# Altium footprint library ICs And Semiconductors THD.PcbLib: 350 footprints (part 1 of 22) (continued)
## APEX_PA93_h [mm] "Power SIP, EC Package Style, Pitch 2.54mm, Right Angle Formed Leads For Horizontal Mount" (continued)
Notvisible:
  circle w0.1: c11.43,0.003 r1
  circle w0.1: c6.35,0.003 r1
  circle w0.1: c-3.81,0.003 r1
  circle w0.1: c-8.89,0.003 r1
  circle w0.1: c0,21.003 r2.75
  circle w0.1: c-13.97,0.003 r1
  circle w0.1: c-11.43,0.003 r1
  circle w0.1: c-6.35,0.003 r1
  circle w0.1: c-1.27,0.003 r1
  circle w0.1: c1.27,0.003 r1
  circle w0.1: c3.81,0.003 r1
  circle w0.1: c8.89,0.003 r1
  circle w0.1: c13.97,0.003 r1
  lines w0.1: -14.97,0.003 -13.97,0.003 -13.97,-0.997 ; -14.36,0.984 cw(c-14.719,0.625) -14.32,0.94 ; -13.62,0.94 cw(c-13.221,0.625) -13.58,0.984 ; -12.43,0.003 -11.43,0.003 -11.43,-0.997 ; -11.82,0.984 cw(c-12.179,0.625) -11.78,0.94 ; -11.08,0.94 cw(c-10.681,0.625) -11.04,0.984 ; -9.89,0.003 -8.89,0.003 -8.89,-0.997 ; -9.28,0.984 cw(c-9.639,0.625) -9.24,0.94 ; -8.54,0.94 cw(c-8.141,0.625) -8.5,0.984 ; -7.35,0.003 -6.35,0.003 -6.35,-0.997 ; -6.74,0.984 cw(c-7.099,0.625) -6.7,0.94 ; -6,0.94 cw(c-5.601,0.625) -5.96,0.984 ; -4.81,0.003 -3.81,0.003 -3.81,-0.997 ; -4.2,0.984 cw(c-4.559,0.625) -4.16,0.94 ; -3.46,0.94 cw(c-3.061,0.625) -3.42,0.984 ; -2.27,0.003 -1.27,0.003 -1.27,-0.997 ; -1.66,0.984 cw(c-2.019,0.625) -1.62,0.94 ; -0.92,0.94 cw(c-0.521,0.625) -0.88,0.984 ; -0.508,21.003 0,21.003 0,20.495 ; 0.27,0.003 1.27,0.003 1.27,-0.997 ; 0.88,0.984 cw(c0.521,0.625) 0.92,0.94 ; 1.62,0.94 cw(c2.019,0.625) 1.66,0.984 ; 2.81,0.003 3.81,0.003 3.81,-0.997 ; 3.42,0.984 cw(c3.061,0.625) 3.46,0.94 ; 4.16,0.94 cw(c4.559,0.625) 4.2,0.984 ; 5.35,0.003 6.35,0.003 6.35,-0.997 ; 5.96,0.984 cw(c5.601,0.625) 6,0.94 ; 6.7,0.94 cw(c7.099,0.625) 6.74,0.984 ; 7.89,0.003 8.89,0.003 8.89,-0.997 ; 8.5,0.984 cw(c8.141,0.625) 8.54,0.94 ; 9.24,0.94 cw(c9.639,0.625) 9.28,0.984 ; 10.43,0.003 11.43,0.003 11.43,-0.997 ; 11.04,0.984 cw(c10.681,0.625) 11.08,0.94 ; 11.78,0.94 cw(c12.179,0.625) 11.82,0.984 ; 12.97,0.003 13.97,0.003 13.97,-0.997 ; 13.58,0.984 cw(c13.221,0.625) 13.62,0.94 ; 14.32,0.94 cw(c14.719,0.625) 14.36,0.984
  text "! ADD COPPER & TOP SOLDER FOR CASE !" at -15.24,10.795 h1
Mechanical 14:
  drawing of 190 lines, arcs and shapes, not listed
3D body "APEX_PA93_h.stp": height 6.86, standoff -1.86, extent -15.494,-0.213 15.494,23.645

## APEX_PA93_v [mm] "Power 12 Pin SIP, DP Package Style, Pitch 2.54mm, Straight Leads For Vertical Mount"
height 23.14
pads (12):
  round 1.6 hole 0.9: 1(-13.97,0) 2(-11.43,0) 3(-8.89,0) 4(-6.35,0) 5(-3.81,0) 6(-1.27,0) 7(1.27,0) 8(3.81,0) 9(6.35,0) 10(8.89,0) 11(11.43,0) 12(13.97,0)
Top Overlay:
  circle w0.3: c-13.97,-1.905 r0.15
  lines w0.2: -15.494,1.118 15.494,1.118 ; -15.494,2.134 15.494,2.134 ; -15.24,-2.616 -15.24,-2.87 15.24,-2.87 15.24,-2.616 ; -1.981,2.134 -1.981,3.988 ; 1.981,2.134 1.981,3.988 ; -15.494,-2.616 -15.494,3.988 15.494,3.988 15.494,-2.616 -15.494,-2.616
Notvisible:
  lines w0.1: -14.97,0 -13.97,0 -13.97,-1 ; -14.211,-0.216 -14.211,0.216 ; -13.729,-0.216 -13.729,0.216 ; -12.43,0 -11.43,0 -11.43,-1 ; -11.671,-0.216 -11.671,0.216 ; -11.189,-0.216 -11.189,0.216 ; -7.35,0 -6.35,0 -6.35,-1 ; -6.591,-0.216 -6.591,0.216 ; -6.109,-0.216 -6.109,0.216 ; -2.27,0 -1.27,0 -1.27,-1 ; -1.511,-0.216 -1.511,0.216 ; -1.029,-0.216 -1.029,0.216 ; 0.27,0 1.27,0 1.27,-1 ; 1.029,-0.216 1.029,0.216 ; 1.511,-0.216 1.511,0.216 ; 2.81,0 3.81,0 3.81,-1 ; 3.569,-0.216 3.569,0.216 ; 4.051,-0.216 4.051,0.216 ; 7.89,0 8.89,0 8.89,-1 ; 8.649,-0.216 8.649,0.216 ; 9.131,-0.216 9.131,0.216 ; 12.97,0 13.97,0 13.97,-1 ; 13.729,-0.216 13.729,0.216 ; 14.211,-0.216 14.211,0.216 ; -14.605,-0.216 -14.605,0.216 -13.335,0.216 -13.335,-0.216 -14.605,-0.216 ; -12.065,-0.216 -12.065,0.216 -10.795,0.216 -10.795,-0.216 -12.065,-0.216 ; -6.985,-0.216 -6.985,0.216 -5.715,0.216 -5.715,-0.216 -6.985,-0.216 ; -1.905,-0.216 -1.905,0.216 -0.635,0.216 -0.635,-0.216 -1.905,-0.216 ; 0.635,-0.216 0.635,0.216 1.905,0.216 1.905,-0.216 0.635,-0.216 ; 3.175,-0.216 3.175,0.216 4.445,0.216 4.445,-0.216 3.175,-0.216 ; 8.255,-0.216 8.255,0.216 9.525,0.216 9.525,-0.216 8.255,-0.216 ; 13.335,-0.216 13.335,0.216 14.605,0.216 14.605,-0.216 13.335,-0.216
Mechanical 14:
  circle w0.3: c-13.97,-1.905 r0.15
  lines w0.1: -15.494,1.118 15.494,1.118 ; -15.494,2.134 15.494,2.134 ; -15.24,-2.616 -15.24,-2.87 15.24,-2.87 15.24,-2.616 ; -1.981,2.134 -1.981,3.988 ; 1.981,2.134 1.981,3.988 ; -15.494,-2.616 -15.494,3.988 15.494,3.988 15.494,-2.616 -15.494,-2.616
3D body "APEX_PA93_v.stp": height 23.14, standoff -3.1, extent -15.494,-2.87 15.494,3.988

## APEX_PA94_h [mm] "Power SIP, EC Package Style, Pitch 2.54mm, Right Angle Formed Leads For Horizontal Mount"
height 6.86
pads (8):
  round 1.6 hole 0.9: 1(-13.97,0) 2(-11.43,0) 4(-6.35,0) 6(-1.27,0) 7(1.27,0) 8(3.81,0) 10(8.89,0) 12(13.97,0)
Top Overlay:
  circle w0.3: c-13.97,1.905 r0.15
  lines w0.2: -15.24,4.595 -15.24,1.725 -14.605,1.725 ; -14.732,16.66 ccw(c-14.732,17.422) -13.97,17.422 -13.97,17.777 -2.535,23.603 cw(c-2.362,23.264) -1.981,23.264 -1.981,21.003 ccw(c0,21.003) 1.981,21.003 1.981,23.264 cw(c2.362,23.264) 2.535,23.603 13.97,17.777 13.97,17.422 ccw(c14.732,17.422) 14.732,16.66 ; -14.478,4.595 -14.478,3.426 -14.605,3.02 -14.605,1.229 -14.36,0.984 ; -13.58,0.984 -13.335,1.229 -13.335,3.02 -13.462,3.426 -13.462,4.595 ; -13.335,1.725 -12.065,1.725 ; -11.938,4.595 -11.938,3.426 -12.065,3.02 -12.065,1.229 -11.82,0.984 ; -11.04,0.984 -10.795,1.229 -10.795,3.02 -10.922,3.426 -10.922,4.595 ; -10.795,1.725 -6.985,1.725 ; -6.858,4.595 -6.858,3.426 -6.985,3.02 -6.985,1.229 -6.74,0.984 ; -5.96,0.984 -5.715,1.229 -5.715,3.02 -5.842,3.426 -5.842,4.595 ; -5.715,1.725 -1.905,1.725 ; -1.778,4.595 -1.778,3.426 -1.905,3.02 -1.905,1.229 -1.66,0.984 ; -0.88,0.984 -0.635,1.229 -0.635,3.02 -0.762,3.426 -0.762,4.595 ; -0.635,1.725 0.635,1.725 ; 0.762,4.595 0.762,3.426 0.635,3.02 0.635,1.229 0.88,0.984 ; 1.66,0.984 1.905,1.229 1.905,3.02 1.778,3.426 1.778,4.595 ; 1.905,1.725 3.175,1.725 ; 3.302,4.595 3.302,3.426 3.175,3.02 3.175,1.229 3.42,0.984 ; 4.2,0.984 4.445,1.229 4.445,3.02 4.318,3.426 4.318,4.595 ; 4.445,1.725 8.255,1.725 ; 8.382,4.595 8.382,3.426 8.255,3.02 8.255,1.229 8.5,0.984 ; 9.28,0.984 9.525,1.229 9.525,3.02 9.398,3.426 9.398,4.595 ; 9.525,1.725 13.335,1.725 ; 13.462,4.595 13.462,3.426 13.335,3.02 13.335,1.229 13.58,0.984 ; 14.36,0.984 14.605,1.229 14.605,3.02 14.478,3.426 14.478,4.595 ; 14.605,1.725 15.24,1.725 15.24,4.595 ; -15.494,4.595 15.494,4.595 15.494,16.66 -15.494,16.66 -15.494,4.595 ; -15.24,4.849 15.24,4.849 15.24,16.406 -15.24,16.406 -15.24,4.849 ; -14.478,5.611 -13.785,6.881 -13.093,5.611 -14.478,5.611
Notvisible:
  circle w0.1: c0,21.003 r2.75
  circle w0.1: c-13.97,0.003 r1
  circle w0.1: c-11.43,0.003 r1
  circle w0.1: c-6.35,0.003 r1
  circle w0.1: c-1.27,0.003 r1
  circle w0.1: c1.27,0.003 r1
  circle w0.1: c3.81,0.003 r1
  circle w0.1: c8.89,0.003 r1
  circle w0.1: c13.97,0.003 r1
  lines w0.1: -14.97,0.003 -13.97,0.003 -13.97,-0.997 ; -14.36,0.984 cw(c-14.719,0.625) -14.32,0.94 ; -13.62,0.94 cw(c-13.221,0.625) -13.58,0.984 ; -12.43,0.003 -11.43,0.003 -11.43,-0.997 ; -11.82,0.984 cw(c-12.179,0.625) -11.78,0.94 ; -11.08,0.94 cw(c-10.681,0.625) -11.04,0.984 ; -7.35,0.003 -6.35,0.003 -6.35,-0.997 ; -6.74,0.984 cw(c-7.099,0.625) -6.7,0.94 ; -6,0.94 cw(c-5.601,0.625) -5.96,0.984 ; -2.27,0.003 -1.27,0.003 -1.27,-0.997 ; -1.66,0.984 cw(c-2.019,0.625) -1.62,0.94 ; -0.92,0.94 cw(c-0.521,0.625) -0.88,0.984 ; -0.508,21.003 0,21.003 0,20.495 ; 0.27,0.003 1.27,0.003 1.27,-0.997 ; 0.88,0.984 cw(c0.521,0.625) 0.92,0.94 ; 1.62,0.94 cw(c2.019,0.625) 1.66,0.984 ; 2.81,0.003 3.81,0.003 3.81,-0.997 ; 3.42,0.984 cw(c3.061,0.625) 3.46,0.94 ; 4.16,0.94 cw(c4.559,0.625) 4.2,0.984 ; 7.89,0.003 8.89,0.003 8.89,-0.997 ; 8.5,0.984 cw(c8.141,0.625) 8.54,0.94 ; 9.24,0.94 cw(c9.639,0.625) 9.28,0.984 ; 12.97,0.003 13.97,0.003 13.97,-0.997 ; 13.58,0.984 cw(c13.221,0.625) 13.62,0.94 ; 14.32,0.94 cw(c14.719,0.625) 14.36,0.984
  text "! ADD COPPER & TOP SOLDER FOR CASE !" at -15.24,10.795 h1
Mechanical 14:
  circle w0.3: c-13.97,1.905 r0.15
  lines w0.1: -15.24,4.595 -15.24,1.725 -14.605,1.725 ; -14.732,16.66 ccw(c-14.732,17.422) -13.97,17.422 -13.97,17.777 -2.535,23.603 cw(c-2.362,23.264) -1.981,23.264 -1.981,21.003 ccw(c0,21.003) 1.981,21.003 1.981,23.264 cw(c2.362,23.264) 2.535,23.603 13.97,17.777 13.97,17.422 ccw(c14.732,17.422) 14.732,16.66 ; -14.478,4.595 -14.478,3.426 -14.605,3.02 -14.605,1.229 -14.36,0.984 cw(c-14.719,0.625) -14.211,0.625 -14.211,-0.213 -13.729,-0.213 -13.729,0.625 cw(c-13.221,0.625) -13.58,0.984 -13.335,1.229 -13.335,3.02 -13.462,3.426 -13.462,4.595 ; -13.335,1.725 -12.065,1.725 ; -11.938,4.595 -11.938,3.426 -12.065,3.02 -12.065,1.229 -11.82,0.984 cw(c-12.179,0.625) -11.671,0.625 -11.671,-0.213 -11.189,-0.213 -11.189,0.625 cw(c-10.681,0.625) -11.04,0.984 -10.795,1.229 -10.795,3.02 -10.922,3.426 -10.922,4.595 ; -10.795,1.725 -6.985,1.725 ; -6.858,4.595 -6.858,3.426 -6.985,3.02 -6.985,1.229 -6.74,0.984 cw(c-7.099,0.625) -6.591,0.625 -6.591,-0.213 -6.109,-0.213 -6.109,0.625 cw(c-5.601,0.625) -5.96,0.984 -5.715,1.229 -5.715,3.02 -5.842,3.426 -5.842,4.595 ; -5.715,1.725 -1.905,1.725 ; -1.778,4.595 -1.778,3.426 -1.905,3.02 -1.905,1.229 -1.66,0.984 cw(c-2.019,0.625) -1.511,0.625 -1.511,-0.213 -1.029,-0.213 -1.029,0.625 cw(c-0.521,0.625) -0.88,0.984 -0.635,1.229 -0.635,3.02 -0.762,3.426 -0.762,4.595 ; -0.635,1.725 0.635,1.725 ; 0.762,4.595 0.762,3.426 0.635,3.02 0.635,1.229 0.88,0.984 cw(c0.521,0.625) 1.029,0.625 1.029,-0.213 1.511,-0.213 1.511,0.625 cw(c2.019,0.625) 1.66,0.984 1.905,1.229 1.905,3.02 1.778,3.426 1.778,4.595 ; 1.905,1.725 3.175,1.725 ; 3.302,4.595 3.302,3.426 3.175,3.02 3.175,1.229 3.42,0.984 cw(c3.061,0.625) 3.569,0.625 3.569,-0.213 4.051,-0.213 4.051,0.625 cw(c4.559,0.625) 4.2,0.984 4.445,1.229 4.445,3.02 4.318,3.426 4.318,4.595 ; 4.445,1.725 8.255,1.725 ; 8.382,4.595 8.382,3.426 8.255,3.02 8.255,1.229 8.5,0.984 cw(c8.141,0.625) 8.649,0.625 8.649,-0.213 9.131,-0.213 9.131,0.625 cw(c9.639,0.625) 9.28,0.984 9.525,1.229 9.525,3.02 9.398,3.426 9.398,4.595 ; 9.525,1.725 13.335,1.725 ; 13.462,4.595 13.462,3.426 13.335,3.02 13.335,1.229 13.58,0.984 cw(c13.221,0.625) 13.729,0.625 13.729,-0.213 14.211,-0.213 14.211,0.625 cw(c14.719,0.625) 14.36,0.984 14.605,1.229 14.605,3.02 14.478,3.426 14.478,4.595 ; 14.605,1.725 15.24,1.725 15.24,4.595 ; -15.494,4.595 15.494,4.595 15.494,16.66 -15.494,16.66 -15.494,4.595 ; -15.24,4.849 15.24,4.849 15.24,16.406 -15.24,16.406 -15.24,4.849 ; -14.478,5.611 -13.785,6.881 -13.093,5.611 -14.478,5.611
3D body "APEX_PA94_h.stp": height 6.86, standoff -1.86, extent -15.494,-0.213 15.494,23.645

## APEX_PA94_hflip [mm] "Power SIP, DQ Package Style, Pitch 2.54mm, Reverse Right Angle Formed Original Straight Leads For Flipped  Horizontal Mount"
height 10
pads (8):
  round 1.6 hole 0.9: 1(13.97,0) 2(11.43,0) 4(6.35,0) 6(1.27,0) 7(-1.27,0) 8(-3.81,0) 10(-8.89,0) 12(-13.97,0)
Top Overlay:
  circle w0.3: c13.97,1.905 r0.15
  lines w0.2: -15.24,4.592 -15.24,1.721 -14.605,1.721 ; -14.478,4.592 -14.478,3.423 -14.605,3.017 -14.605,1.226 -14.36,0.981 cw(c-14.719,0.622) -14.32,0.937 ; -13.62,0.937 cw(c-13.221,0.622) -13.58,0.981 -13.335,1.226 -13.335,3.017 -13.462,3.423 -13.462,4.592 ; -13.335,1.721 -9.525,1.721 ; -9.398,4.592 -9.398,3.423 -9.525,3.017 -9.525,1.226 -9.28,0.981 cw(c-9.639,0.622) -9.24,0.937 ; -8.54,0.937 cw(c-8.141,0.622) -8.5,0.981 -8.255,1.226 -8.255,3.017 -8.382,3.423 -8.382,4.592 ; -8.255,1.721 -4.445,1.721 ; -4.318,4.592 -4.318,3.423 -4.445,3.017 -4.445,1.226 -4.2,0.981 cw(c-4.559,0.622) -4.16,0.937 ; -3.46,0.937 cw(c-3.061,0.622) -3.42,0.981 -3.175,1.226 -3.175,3.017 -3.302,3.423 -3.302,4.592 ; -3.175,1.721 -1.905,1.721 ; -1.778,4.592 -1.778,3.423 -1.905,3.017 -1.905,1.226 -1.66,0.981 cw(c-2.019,0.622) -1.62,0.937 ; -0.92,0.937 cw(c-0.521,0.622) -0.88,0.981 -0.635,1.226 -0.635,3.017 -0.762,3.423 -0.762,4.592 ; -0.635,1.721 0.635,1.721 ; 0.762,4.592 0.762,3.423 0.635,3.017 0.635,1.226 0.88,0.981 cw(c0.521,0.622) 0.92,0.937 ; 1.62,0.937 cw(c2.019,0.622) 1.66,0.981 1.905,1.226 1.905,3.017 1.778,3.423 1.778,4.592 ; 1.905,1.721 5.715,1.721 ; 5.842,4.592 5.842,3.423 5.715,3.017 5.715,1.226 5.96,0.981 cw(c5.601,0.622) 6,0.937 ; 6.7,0.937 cw(c7.099,0.622) 6.74,0.981 6.985,1.226 6.985,3.017 6.858,3.423 6.858,4.592 ; 6.985,1.721 10.795,1.721 ; 10.922,4.592 10.922,3.423 10.795,3.017 10.795,1.226 11.04,0.981 cw(c10.681,0.622) 11.08,0.937 ; 11.78,0.937 cw(c12.179,0.622) 11.82,0.981 12.065,1.226 12.065,3.017 11.938,3.423 11.938,4.592 ; 12.065,1.721 13.335,1.721 ; 13.462,4.592 13.462,3.423 13.335,3.017 13.335,1.226 13.58,0.981 cw(c13.221,0.622) 13.62,0.937 ; 14.32,0.937 cw(c14.719,0.622) 14.36,0.981 14.605,1.226 14.605,3.017 14.478,3.423 14.478,4.592 ; 14.605,1.721 15.24,1.721 15.24,4.592 ; -15.494,4.592 15.494,4.592 15.494,16.657 14.732,16.657 cw(c14.732,17.419) 13.97,17.419 13.97,17.774 2.535,23.6 ccw(c2.362,23.261) 1.981,23.261 1.981,21 cw(c0,21) -1.981,21 -1.981,23.261 ccw(c-2.362,23.261) -2.535,23.6 -13.97,17.774 -13.97,17.419 cw(c-14.732,17.419) -14.732,16.657 -15.494,16.657 -15.494,4.592 ; 13.093,5.608 13.785,6.878 14.478,5.608 13.093,5.608
Notvisible:
  circle w0.1: c0,21 r2.75
  circle w0.1: c13.97,0 r1
  circle w0.1: c11.43,0 r1
  circle w0.1: c6.35,0 r1
  circle w0.1: c1.27,0 r1
  circle w0.1: c-1.27,0 r1
  circle w0.1: c-3.81,0 r1
  circle w0.1: c-8.89,0 r1
  circle w0.1: c-13.97,0 r1
  lines w0.1: -14.42,0 -13.97,0 -13.97,-0.45 ; -9.34,0 -8.89,0 -8.89,-0.45 ; -4.26,0 -3.81,0 -3.81,-0.45 ; -1.72,0 -1.27,0 -1.27,-0.45 ; -1,21 0,21 0,20 ; 0.82,0 1.27,0 1.27,-0.45 ; 5.9,0 6.35,0 6.35,-0.45 ; 10.98,0 11.43,0 11.43,-0.45 ; 13.52,0 13.97,0 13.97,-0.45
  text "! USED WITH HEAT SINK AND SOCKET !" at -13.97,10.795 h1
Mechanical 14:
  circle w0.3: c13.97,1.905 r0.15
  lines w0.1: -15.24,4.592 -15.24,1.721 -14.605,1.721 ; -14.478,4.592 -14.478,3.423 -14.605,3.017 -14.605,1.226 -14.36,0.981 cw(c-14.719,0.622) -14.211,0.622 -14.211,-0.216 -13.729,-0.216 -13.729,0.622 cw(c-13.221,0.622) -13.58,0.981 -13.335,1.226 -13.335,3.017 -13.462,3.423 -13.462,4.592 ; -13.335,1.721 -9.525,1.721 ; -9.398,4.592 -9.398,3.423 -9.525,3.017 -9.525,1.226 -9.28,0.981 cw(c-9.639,0.622) -9.131,0.622 -9.131,-0.216 -8.649,-0.216 -8.649,0.622 cw(c-8.141,0.622) -8.5,0.981 -8.255,1.226 -8.255,3.017 -8.382,3.423 -8.382,4.592 ; -8.255,1.721 -4.445,1.721 ; -4.318,4.592 -4.318,3.423 -4.445,3.017 -4.445,1.226 -4.2,0.981 cw(c-4.559,0.622) -4.051,0.622 -4.051,-0.216 -3.569,-0.216 -3.569,0.622 cw(c-3.061,0.622) -3.42,0.981 -3.175,1.226 -3.175,3.017 -3.302,3.423 -3.302,4.592 ; -3.175,1.721 -1.905,1.721 ; -1.778,4.592 -1.778,3.423 -1.905,3.017 -1.905,1.226 -1.66,0.981 cw(c-2.019,0.622) -1.511,0.622 -1.511,-0.216 -1.029,-0.216 -1.029,0.622 cw(c-0.521,0.622) -0.88,0.981 -0.635,1.226 -0.635,3.017 -0.762,3.423 -0.762,4.592 ; -0.635,1.721 0.635,1.721 ; 0.762,4.592 0.762,3.423 0.635,3.017 0.635,1.226 0.88,0.981 cw(c0.521,0.622) 1.029,0.622 1.029,-0.216 1.511,-0.216 1.511,0.622 cw(c2.019,0.622) 1.66,0.981 1.905,1.226 1.905,3.017 1.778,3.423 1.778,4.592 ; 1.905,1.721 5.715,1.721 ; 5.842,4.592 5.842,3.423 5.715,3.017 5.715,1.226 5.96,0.981 cw(c5.601,0.622) 6.109,0.622 6.109,-0.216 6.591,-0.216 6.591,0.622 cw(c7.099,0.622) 6.74,0.981 6.985,1.226 6.985,3.017 6.858,3.423 6.858,4.592 ; 6.985,1.721 10.795,1.721 ; 10.922,4.592 10.922,3.423 10.795,3.017 10.795,1.226 11.04,0.981 cw(c10.681,0.622) 11.189,0.622 11.189,-0.216 11.671,-0.216 11.671,0.622 cw(c12.179,0.622) 11.82,0.981 12.065,1.226 12.065,3.017 11.938,3.423 11.938,4.592 ; 12.065,1.721 13.335,1.721 ; 13.462,4.592 13.462,3.423 13.335,3.017 13.335,1.226 13.58,0.981 cw(c13.221,0.622) 13.729,0.622 13.729,-0.216 14.211,-0.216 14.211,0.622 cw(c14.719,0.622) 14.36,0.981 14.605,1.226 14.605,3.017 14.478,3.423 14.478,4.592 ; 14.605,1.721 15.24,1.721 15.24,4.592 ; -15.494,4.592 15.494,4.592 15.494,16.657 14.732,16.657 cw(c14.732,17.419) 13.97,17.419 13.97,17.774 2.535,23.6 ccw(c2.362,23.261) 1.981,23.261 1.981,21 cw(c0,21) -1.981,21 -1.981,23.261 ccw(c-2.362,23.261) -2.535,23.6 -13.97,17.774 -13.97,17.419 cw(c-14.732,17.419) -14.732,16.657 -15.494,16.657 -15.494,4.592 ; 13.093,5.608 13.785,6.878 14.478,5.608 13.093,5.608
3D body "APEX_PA94_hflip.stp": height 7, standoff -2.84, extent -15.494,-0.216 15.494,23.641

## APEX_PA94_v [mm] "Power SIP, DQ Package Style, Pitch 2.54mm, Straight Leads For Vertical Mount"
height 23.14
pads (8):
  round 1.6 hole 0.9: 1(-13.97,0) 2(-11.43,0) 4(-6.35,0) 6(-1.27,0) 7(1.27,0) 8(3.81,0) 10(8.89,0) 12(13.97,0)
Top Overlay:
  circle w0.3: c-13.97,-1.905 r0.15
  lines w0.2: -15.494,1.118 15.494,1.118 ; -15.494,2.134 15.494,2.134 ; -15.24,-2.616 -15.24,-2.87 15.24,-2.87 15.24,-2.616 ; -1.981,2.134 -1.981,3.988 ; 1.981,2.134 1.981,3.988 ; -15.494,-2.616 -15.494,3.988 15.494,3.988 15.494,-2.616 -15.494,-2.616
Notvisible:
  lines w0.1: -14.97,0 -13.97,0 -13.97,-1 ; -14.211,-0.216 -14.211,0.216 ; -13.729,-0.216 -13.729,0.216 ; -12.43,0 -11.43,0 -11.43,-1 ; -11.671,-0.216 -11.671,0.216 ; -11.189,-0.216 -11.189,0.216 ; -7.35,0 -6.35,0 -6.35,-1 ; -6.591,-0.216 -6.591,0.216 ; -6.109,-0.216 -6.109,0.216 ; -2.27,0 -1.27,0 -1.27,-1 ; -1.511,-0.216 -1.511,0.216 ; -1.029,-0.216 -1.029,0.216 ; 0.27,0 1.27,0 1.27,-1 ; 1.029,-0.216 1.029,0.216 ; 1.511,-0.216 1.511,0.216 ; 2.81,0 3.81,0 3.81,-1 ; 3.569,-0.216 3.569,0.216 ; 4.051,-0.216 4.051,0.216 ; 7.89,0 8.89,0 8.89,-1 ; 8.649,-0.216 8.649,0.216 ; 9.131,-0.216 9.131,0.216 ; 12.97,0 13.97,0 13.97,-1 ; 13.729,-0.216 13.729,0.216 ; 14.211,-0.216 14.211,0.216 ; -14.605,-0.216 -14.605,0.216 -13.335,0.216 -13.335,-0.216 -14.605,-0.216 ; -12.065,-0.216 -12.065,0.216 -10.795,0.216 -10.795,-0.216 -12.065,-0.216 ; -6.985,-0.216 -6.985,0.216 -5.715,0.216 -5.715,-0.216 -6.985,-0.216 ; -1.905,-0.216 -1.905,0.216 -0.635,0.216 -0.635,-0.216 -1.905,-0.216 ; 0.635,-0.216 0.635,0.216 1.905,0.216 1.905,-0.216 0.635,-0.216 ; 3.175,-0.216 3.175,0.216 4.445,0.216 4.445,-0.216 3.175,-0.216 ; 8.255,-0.216 8.255,0.216 9.525,0.216 9.525,-0.216 8.255,-0.216 ; 13.335,-0.216 13.335,0.216 14.605,0.216 14.605,-0.216 13.335,-0.216
Mechanical 14:
  circle w0.3: c-13.97,-1.905 r0.15
  lines w0.1: -15.494,1.118 15.494,1.118 ; -15.494,2.134 15.494,2.134 ; -15.24,-2.616 -15.24,-2.87 15.24,-2.87 15.24,-2.616 ; -1.981,2.134 -1.981,3.988 ; 1.981,2.134 1.981,3.988 ; -15.494,-2.616 -15.494,3.988 15.494,3.988 15.494,-2.616 -15.494,-2.616
3D body "APEX_PA94_v.stp": height 23.14, standoff -3.1, extent -15.494,-2.87 15.494,3.988

## CDIP8-300 [mm] "DIP 8 Leads, Row Spacing 7.62 mm; Pitch 2.54 mm"
height 5.08
pads (8):
  rect 1.6x1.6 hole 0.9: 1(-3.81,3.81)
  round 1.6 hole 0.9: 2(-3.81,1.27) 3(-3.81,-1.27) 4(-3.81,-3.81) 5(3.81,-3.81) 6(3.81,-1.27) 7(3.81,1.27) 8(3.81,3.81)
Top Overlay:
  lines w0.2: -0.635,5.15 ccw(c0,5.15) 0.635,5.15 ; -0.635,5.15 ccw(c0,5.15) 0.635,5.15 ; -0.635,5.15 -2.65,5.15 -2.65,-5.15 2.65,-5.15 2.65,5.15 0.635,5.15
Mechanical 14:
  circle w0.1: c-1.905,3.81 r0.254
  lines w0.1: -3.3,-5.15 -3.3,5.15 -0.635,5.15 ccw(c0,5.15) 0.635,5.15 3.3,5.15 3.3,-5.15 -3.3,-5.15
3D body "CDIP8-300.stp": height 5.34, standoff -5.08, extent -4.04,-5.08 4.04,5.08

## CDIP28-600 [mm] "28 Leads Ceramic Dual In-Line Package Q-28-2, Row Spacing 15.24mm; Pitch 2.54mm"
height 5.59
pads (28):
  rect 1.6x1.6 hole 0.9: 1(-7.62,16.51)
  round 1.6 hole 0.9: 2(-7.62,13.97) 3(-7.62,11.43) 4(-7.62,8.89) 5(-7.62,6.35) 6(-7.62,3.81) 7(-7.62,1.27) 8(-7.62,-1.27) 9(-7.62,-3.81) 10(-7.62,-6.35) 11(-7.62,-8.89) 12(-7.62,-11.43) 13(-7.62,-13.97) 14(-7.62,-16.51) 15(7.62,-16.51) 16(7.62,-13.97) 17(7.62,-11.43) 18(7.62,-8.89) 19(7.62,-6.35) 20(7.62,-3.81) 21(7.62,-1.27) 22(7.62,1.27) 23(7.62,3.81) 24(7.62,6.35) 25(7.62,8.89) 26(7.62,11.43) 27(7.62,13.97) 28(7.62,16.51)
Top Overlay:
  lines w0.2: -6.35,-18.925 -6.35,18.925 -0.635,18.925 ccw(c0,18.925) 0.635,18.925 6.35,18.925 6.35,-18.925 -6.35,-18.925
Mechanical 14:
  lines w0.1: -6.35,-18.925 -6.35,18.925 -0.635,18.925 ccw(c0,18.925) 0.635,18.925 6.35,18.925 6.35,-18.925 -6.35,-18.925
3D body "CERDIP28-600.stp": height 5.72, standoff -5.08, extent -7.85,-18.925 7.85,18.925

## CDIP40-600_WINDOW [mm] "40 Leads Dual In-Line Package, Row Spacing 15.24mm; Pitch 2.54mm"
height 5.72
pads (40):
  rect 1.6x1.6 hole 0.9: 1(-7.62,24.13)
  round 1.6 hole 0.9: 2(-7.62,21.59) 3(-7.62,19.05) 4(-7.62,16.51) 5(-7.62,13.97) 6(-7.62,11.43) 7(-7.62,8.89) 8(-7.62,6.35) 9(-7.62,3.81) 10(-7.62,1.27) 11(-7.62,-1.27) 12(-7.62,-3.81) 13(-7.62,-6.35) 14(-7.62,-8.89) 15(-7.62,-11.43) 16(-7.62,-13.97) 17(-7.62,-16.51) 18(-7.62,-19.05) 19(-7.62,-21.59) 20(-7.62,-24.13) 21(7.62,-24.13) 22(7.62,-21.59) 23(7.62,-19.05) 24(7.62,-16.51) 25(7.62,-13.97) 26(7.62,-11.43) 27(7.62,-8.89) 28(7.62,-6.35) 29(7.62,-3.81) 30(7.62,-1.27) 31(7.62,1.27) 32(7.62,3.81) 33(7.62,6.35) 34(7.62,8.89) 35(7.62,11.43) 36(7.62,13.97) 37(7.62,16.51) 38(7.62,19.05) 39(7.62,21.59) 40(7.62,24.13)
Top Overlay:
  lines w0.2: -6.35,-26.25 -6.35,26.25 -0.635,26.25 ccw(c0,26.25) 0.635,26.25 6.35,26.25 6.35,-26.25 -6.35,-26.25
Notvisible:
  drawing of 297 lines, arcs and shapes, not listed
Mechanical 14:
  circle w0.1: c-5.715,24.13 r0.5
  lines w0.1: -7.05,-26.25 -7.05,26.25 -0.635,26.25 ccw(c0,26.25) 0.635,26.25 7.05,26.25 7.05,-26.25 -7.05,-26.25
3D body "CERDIP40-600_WINDOW.stp": height 5.72, standoff -5.08, extent -7.8,-26.25 7.9,26.35

## CELDUC_SKD10306 [mm] "CELDUC SKD Serie, 4 Leads, Body 43.6 x 10.55mm, DC Solid State Relay"
height 25.75
pads (4):
  round 1.9 hole 1.2: 1(13.97,2.54) 2(3.81,2.54) 3(-8.89,2.54) 4(-13.97,2.54)
Top Overlay:
  lines w0.2: -21.8,-5.275 -21.8,5.275 21.8,5.275 21.8,-5.275 -21.8,-5.275
  text "4-" at -14.902,-0.75 h1.5
  text "3+" at -10.085,-0.75 h1.5
  text "2-" at 2.878,-0.75 h1.5
  text "1+" at 12.775,-0.75 h1.5
Notvisible:
  lines w0.1: -14.47,2.54 -13.97,2.54 ; -13.97,2.04 -13.97,2.54 ; -13.97,3.04 -13.97,2.54 ; -13.47,2.54 -13.97,2.54 ; -9.39,2.54 -8.89,2.54 ; -8.89,2.04 -8.89,2.54 ; -8.89,3.04 -8.89,2.54 ; -8.39,2.54 -8.89,2.54 ; -0.5,0 0,0 ; 0,-0.5 0,0 ; 0,0.5 0,0 ; 0.5,0 0,0 ; 3.31,2.54 3.81,2.54 ; 3.81,2.04 3.81,2.54 ; 3.81,3.04 3.81,2.54 ; 4.31,2.54 3.81,2.54 ; 13.47,2.54 13.97,2.54 ; 13.97,2.04 13.97,2.54 ; 13.97,3.04 13.97,2.54 ; 14.47,2.54 13.97,2.54
Mechanical 14:
  lines w0.1: -21.8,-5.275 21.8,-5.275 21.8,5.275 -21.8,5.275 -21.8,-5.275
  text "1+" at 12.775,-0.75 h1.5
  text "2-" at 2.878,-0.75 h1.5
  text "3+" at -10.085,-0.75 h1.5
  text "4-" at -14.902,-0.75 h1.5
3D body "SKD10306.stp": height 25.75, standoff -3.1, extent -21.8,-5.275 21.8,5.275